# Altium footprint library SOT SOD TO DAPK.PcbLib: 156 footprints (part 7 of 10)
Each footprint in its own frame and in the unit in brackets; x right, y up, seen from the top. Pads: shape width x height; smd on the part's side, far side on the other; paste and mask are expansions set on the pad; w line width, h text height; cw(c..) or ccw(c..) is an arc to the next point about the centre after c.
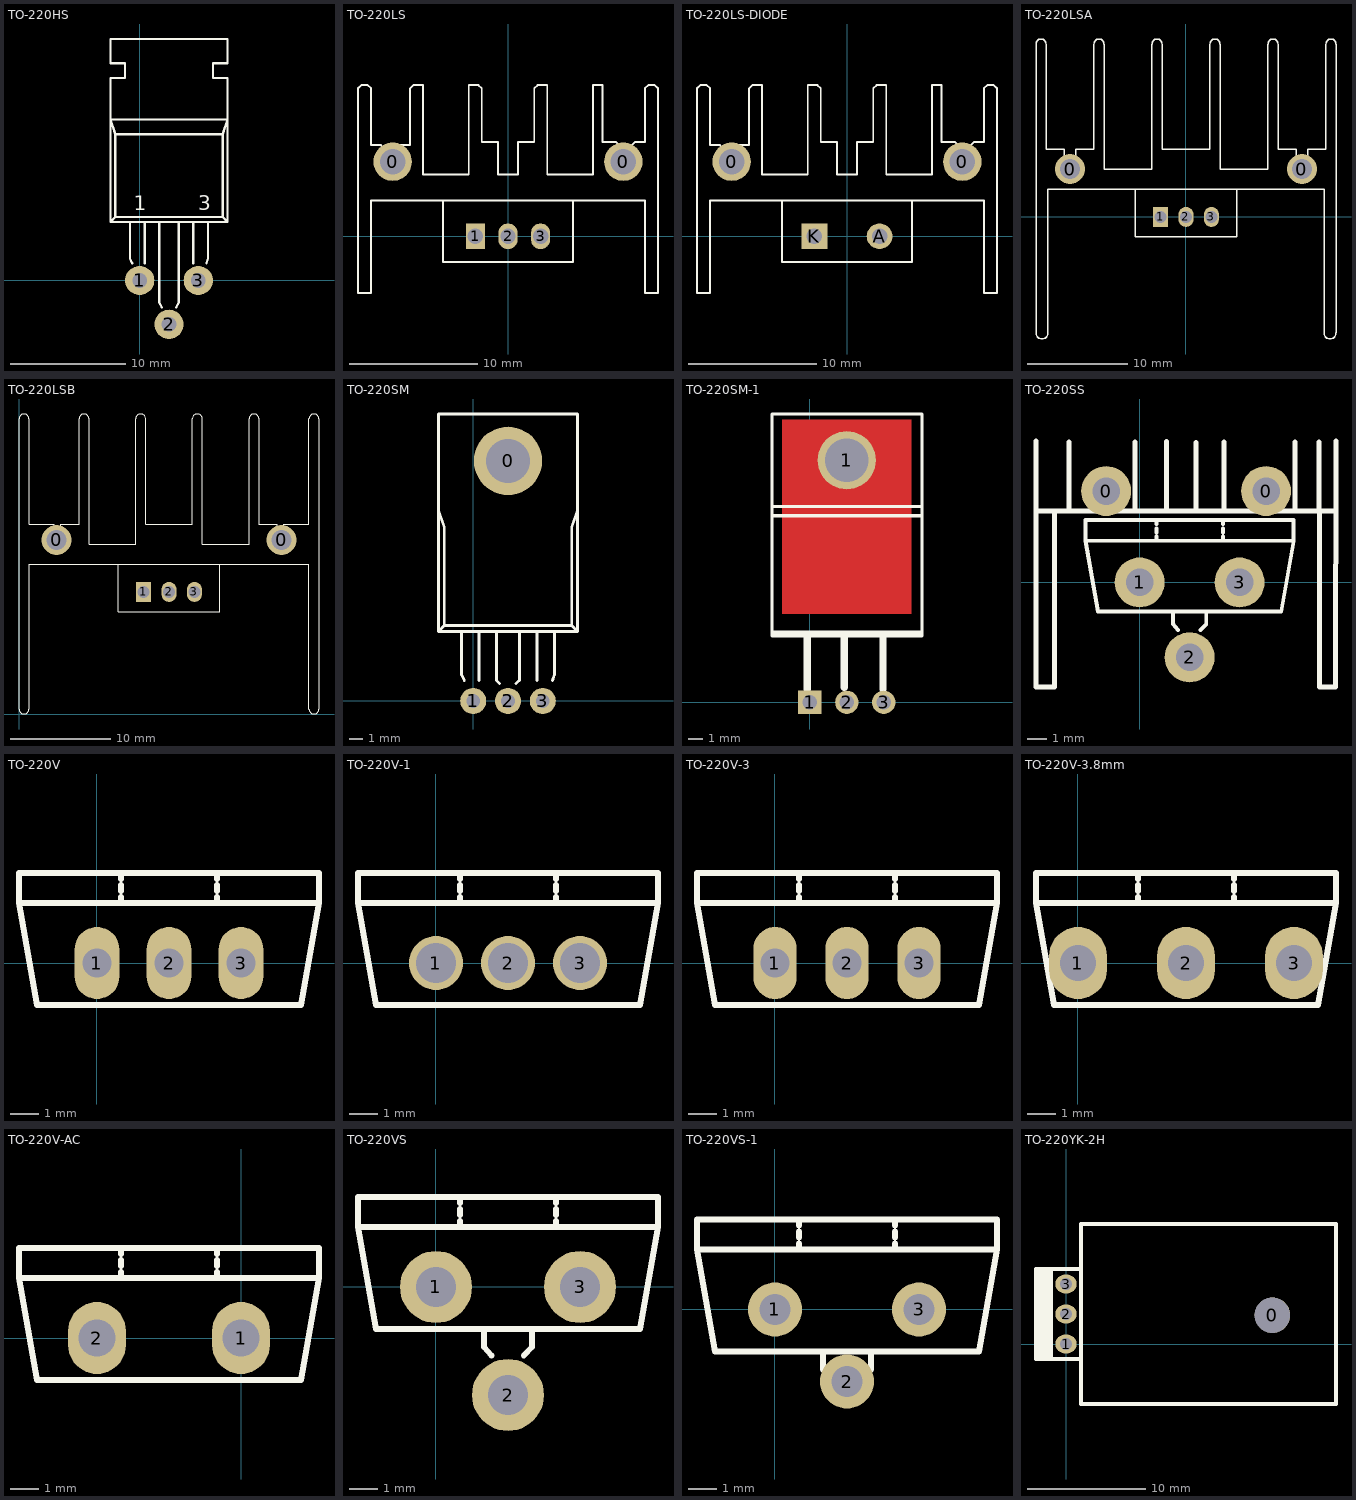
[diagram p6: the footprints below, top view; thin cyan lines are the x and y axes]

## TO-220HS [mil]
pads (3):
  round 100 hole 50: 1(0,0) 2(100,-150) 3(200,0)
Top Overlay:
  lines w7.87: -33.33,200 -33.33,75 -25.8,59.05 ; 16.67,59.05 16.67,200 ; 66.67,200 66.67,-75 75.46,-92.13 ; 124.54,-92.27 133.33,-75 133.33,200 ; 183.33,59.05 183.33,200 ; 228,59.05 233.33,75 233.33,200 ; -100,200 -83.33,216.67 ; -100,200 300,200 ; -100,200 -100,691.67 -50,691.67 -50,741.67 -100,741.67 -100,825 300,825 300,741.67 250,741.67 250,691.67 300,691.67 300,591.67 300,200 ; -83.33,216.67 283.33,216.67 ; -83.33,216.67 -83.33,500 ; -83.33,500 283.33,500 ; -83.33,500 -100,550 300,550 283.33,500 ; 283.33,216.67 283.33,500 ; 283.33,216.67 300,200
  text "1" at -20,240 h50
  text "3" at 200,240 h50
3D body "User Library-TO220 L.STEP": height 177.17, standoff -118.11, extent -98.7,-2.88 295,772.88

## TO-220LS [mm]
pads (5):
  round 3 hole 2: 0(-9,5.822) 0(9,5.822)
  rect 1.5x2 hole 1.2: 1(-2.54,0)
  oval 1.5x2 hole 1.2: 2(0,0) 3(2.54,0)
Top Overlay:
  lines w0.15: -9.668,6.018 -9.668,6.854 -9.922,7.108 -10.684,7.108 -10.684,11.536 -10.938,11.79 -11.446,11.79 -11.7,11.536 -11.7,2.79 -11.7,2.536 -11.7,-4.41 -10.684,-4.41 -10.684,2.79 10.684,2.79 10.684,-4.41 11.7,-4.41 11.7,11.536 11.446,11.79 10.938,11.79 10.684,11.536 10.684,7.362 9.922,7.362 9.668,7.108 9.668,6.079 ; -8.652,6.346 -8.652,6.854 -8.398,7.108 -7.636,7.108 -7.636,11.536 -7.382,11.79 -6.62,11.79 -6.62,4.822 -3.064,4.822 -3.064,11.79 -2.302,11.79 -2.048,11.536 -2.048,7.362 -0.778,7.362 -0.778,4.822 0.778,4.822 0.778,7.362 2.048,7.362 2.048,11.536 2.302,11.79 3.064,11.79 3.064,4.822 6.62,4.822 6.62,11.79 7.382,11.79 7.382,7.362 8.398,7.362 8.652,7.108 8.652,6.346 ; -5.08,2.79 -5.08,-2 5.08,-2 5.08,2.79
3D body "User Library-heat sink-1.step": height 30.62, standoff 0, extent -11.45,-4.535 11.45,11.865
3D body "User Library-POWER MOSFET, NON-SURFACE-MOUNT.step": height 20.8, standoff -7.58, extent -4.834,-1.996 4.818,2.504
3D body "User Library-M3x8.STEP": height 20.6, standoff 15, extent -2.8,-0.35 2.8,9.135

## TO-220LS-DIODE [mm]
pads (4):
  round 3 hole 2: 0(-9,5.822) 0(9,5.822)
  round 2 hole 1.2: A(2.54,0)
  rect 2x2 hole 1.2: K(-2.54,0)
Top Overlay:
  lines w0.15: -9.668,6.018 -9.668,6.854 -9.922,7.108 -10.684,7.108 -10.684,11.536 -10.938,11.79 -11.446,11.79 -11.7,11.536 -11.7,2.79 -11.7,2.536 -11.7,-4.41 -10.684,-4.41 -10.684,2.79 10.684,2.79 10.684,-4.41 11.7,-4.41 11.7,11.536 11.446,11.79 10.938,11.79 10.684,11.536 10.684,7.362 9.922,7.362 9.668,7.108 9.668,6.079 ; -8.652,6.346 -8.652,6.854 -8.398,7.108 -7.636,7.108 -7.636,11.536 -7.382,11.79 -6.62,11.79 -6.62,4.822 -3.064,4.822 -3.064,11.79 -2.302,11.79 -2.048,11.536 -2.048,7.362 -0.778,7.362 -0.778,4.822 0.778,4.822 0.778,7.362 2.048,7.362 2.048,11.536 2.302,11.79 3.064,11.79 3.064,4.822 6.62,4.822 6.62,11.79 7.382,11.79 7.382,7.362 8.398,7.362 8.652,7.108 8.652,6.346 ; -5.08,2.79 -5.08,-2 5.08,-2 5.08,2.79
3D body "User Library-heat sink-1.step": height 30.62, standoff 0, extent -11.45,-4.535 11.45,11.865
3D body "User Library-TO220-D.STEP": height 20.8, standoff -7.58, extent -4.826,-2.075 4.826,2.425
3D body "User Library-M3x8.STEP": height 20.6, standoff 15, extent -2.8,-0.35 2.8,9.135

## TO-220LSA [mm]
pads (5):
  round 3 hole 2: 0(-11.6,4.79) 0(11.6,4.79)
  rect 1.5x2 hole 1.2: 1(-2.54,0)
  oval 1.5x2 hole 1.2: 2(0,0) 3(2.54,0)
Top Overlay:
  lines w0.15: -12.156,5.446 ccw(c-11.6,4.79) -11.035,5.438 ; -12.154,5.446 -12.154,6.79 -14,6.79 -14,17.29 ccw(c-14.5,17.29) -15,17.29 -15,2.79 -15,-11.61 ccw(c-14.4,-11.61) -13.8,-11.61 -13.8,2.79 13.8,2.79 13.8,-11.61 ccw(c14.4,-11.61) 15,-11.61 15,2.79 15,17.29 ccw(c14.5,17.29) 14,17.29 14,6.79 12.154,6.79 12.154,5.438 ; -11.046,5.438 -11.046,6.79 -9.2,6.79 -9.2,17.29 cw(c-8.7,17.29) -8.2,17.29 -8.2,4.79 -3.4,4.79 -3.4,17.29 cw(c-2.9,17.29) -2.4,17.29 -2.4,6.79 2.4,6.79 2.4,17.29 cw(c2.9,17.29) 3.4,17.29 3.4,4.79 8.2,4.79 8.2,17.29 cw(c8.7,17.29) 9.2,17.29 9.2,6.79 11.046,6.79 11.046,5.446 ; -5.08,2.79 -5.08,-2 5.08,-2 5.08,2.79 ; 11.044,5.446 ccw(c11.6,4.79) 12.165,5.438
3D body: height 25, standoff 0, extent -8.859,2.928 9.141,17.435
3D body "User Library-M3x8.STEP": height 20.6, standoff 15, extent -2.8,-0.35 2.8,9.135
3D body "User Library-POWER MOSFET, NON-SURFACE-MOUNT.step": height 20.8, standoff -7.58, extent -4.834,-1.996 4.818,2.504
3D body: height 25, standoff 0, extent -14.855,-12.073 -13.859,16.927
3D body: height 25, standoff 0, extent 14.014,-11.311 15.014,17.689
3D body: height 25, standoff 0, extent -10.599,5.549 -8.799,6.68
3D body: height 25, standoff 0, extent -13.799,5.68 -11.299,6.68
3D body: height 25, standoff 0, extent -13.799,2.688 -11.059,5.085
3D body: height 25, standoff 0, extent -11.059,2.688 -8.799,5.093
3D body: height 25, standoff 0, extent -10.599,5.093 -8.799,5.549
3D body: height 25, standoff 0, extent -13.799,5.085 -11.299,5.68
3D body: height 25, standoff 0, extent 11.701,5.077 14.201,5.672
3D body: height 25, standoff 0, extent 9.201,5.085 11.001,5.541
3D body: height 25, standoff 0, extent 9.201,2.68 11.461,5.085
3D body: height 25, standoff 0, extent 11.461,2.68 14.201,5.077
3D body: height 25, standoff 0, extent 11.701,5.672 14.201,6.672
3D body: height 25, standoff 0, extent 9.201,5.541 11.001,6.672

## TO-220LSB [mm]
pads (5):
  round 3 hole 2: 0(3.75,17.4) 0(26.25,17.4)
  rect 1.5x2 hole 1.2: 1(12.468,12.21)
  oval 1.5x2 hole 1.2: 2(15.008,12.21) 3(17.548,12.21)
Top Overlay:
  lines w0.1: 9.928,15 9.928,10.21 20.088,10.21 20.088,15 ; 24,18.992 25.8,18.992 25.8,17.861 ccw(c26.25,17.392) 26.5,17.992 ; 24,19 24,29.5 ccw(c23.5,29.5) 23,29.5 23,17 18.333,17 18.333,29.5 ccw(c17.833,29.5) 17.333,29.5 17.333,19 12.667,19 12.667,29.5 ccw(c12.167,29.5) 11.667,29.5 11.667,17 7,17 7,29.5 ccw(c6.5,29.5) 6,29.5 6,19 4.2,19 4.2,17.869 cw(c3.75,17.4) 3.5,18 3.5,19 1,19 1,19.01 1,29.5 ccw(c0.5,29.5) 0,29.5 0,0.5 ccw(c0.5,0.5) 1,0.5 1,15 29,15 29,0.5 ccw(c29.5,0.5) 30,0.5 30,29.5 ccw(c29.5,29.5) 29,29.5 29,19.002 ; 26.5,17.992 26.5,18.992 29,18.992 29,19.002 ; 29,19 29,19.002
3D body: height 25, standoff 0, extent 0.004,29.001 1,29.999
3D body: height 25, standoff 0, extent 6.004,29.001 7,29.999
3D body: height 25, standoff 0, extent 11.671,29.001 12.667,29.999
3D body: height 25, standoff 0, extent 17.337,29.001 18.333,29.999
3D body: height 25, standoff 0, extent 23.004,29.001 24,29.999
3D body: height 25, standoff 0, extent 29.004,29.001 30,29.999
3D body: height 25, standoff 0, extent 29.004,0.001 30,0.999
3D body: height 25, standoff 0, extent 0.004,0.001 1,0.999
3D body: height 25, standoff 0, extent 6,14.993 24,29.5
3D body: height 25, standoff 0, extent 24,17.861 25.8,18.992
3D body: height 25, standoff 0, extent 26.5,17.992 29,18.992
3D body: height 25, standoff 0, extent 26.26,15 29,17.397
3D body: height 25, standoff 0, extent 24,15 26.26,17.405
3D body: height 25, standoff 0, extent 24,17.405 25.8,17.861
3D body: height 25, standoff 0, extent 26.5,17.397 29,17.992
3D body: height 25, standoff 0, extent 1,17.405 3.5,18
3D body: height 25, standoff 0, extent 4.2,17.413 6,17.869
3D body: height 25, standoff 0, extent 3.74,15.008 6,17.413
3D body: height 25, standoff 0, extent 1,15.008 3.74,17.405
3D body: height 25, standoff 0, extent 1,18 3.5,19
3D body: height 25, standoff 0, extent 4.2,17.869 6,19
3D body: height 25, standoff 0, extent 0.004,0.5 1,29.5
3D body: height 25, standoff 0, extent 29,0.5 30,29.5
3D body: height 8, standoff -5, extent 3.006,16.652 4.5,18.149
3D body: height 8, standoff -5, extent 25.5,16.643 26.994,18.14
3D body "User Library-POWER MOSFET, NON-SURFACE-MOUNT.step": height 20.8, standoff -7.58, extent 10.174,10.214 19.826,14.714
3D body "User Library-M3x8.STEP": height 20.6, standoff 15, extent 12.2,11.86 17.8,21.345

## TO-220SM [mm]
pads (4):
  round 5 hole 3.2: 0(2.54,17.526)
  round 1.9 hole 1: 1(0,0) 2(2.54,0) 3(5.08,0)
Top Overlay:
  lines w0.2: -2.54,13.97 -2.117,12.7 -2.117,5.503 ; -2.54,17.526 -2.54,18.796 ; -2.54,17.568 -2.54,5.08 ; -2.54,18.838 -2.54,20.955 7.62,20.955 7.62,18.838 ; -0.847,5.08 -0.847,1.905 -0.655,1.5 ; 0.423,1.5 0.423,5.08 ; 1.693,5.08 1.693,1.5 1.923,1.27 ; 3.133,1.27 3.387,1.524 ; 3.387,1.5 3.387,5.08 ; 4.657,1.5 4.657,5.08 ; 5.791,1.5 5.927,1.905 5.927,5.08 ; 7.62,13.97 7.197,12.7 7.197,5.503 ; 7.62,17.526 7.62,18.796 ; 7.62,17.568 7.62,15.028 7.62,5.08 ; -2.54,5.08 7.62,5.08 ; -2.54,5.08 -2.117,5.503 ; -2.117,5.503 7.197,5.503 ; 7.197,5.503 7.62,5.08
3D body "User Library-TO220 L.STEP": height 4.5, standoff -3, extent -2.286,0.054 7.714,19.758

## TO-220SM-1 [mm]
pads (4):
  rect 1.6x1.6 hole 1: 1(0,0)
  round 4 hole 3: 1(2.54,16.637)
  round 1.6 hole 1: 2(2.54,0) 3(5.08,0)
Top Layer:
  rectangle: -1.905,6.071 6.985,19.431
Top Overlay:
  lines w0.22: -2.591,4.699 7.696,4.699 ; -2.591,4.826 7.696,4.826 ; -2.591,12.827 7.696,12.827 ; -2.591,13.462 7.696,13.462 ; -2.591,19.05 -2.591,19.812 7.696,19.812 7.696,4.572 -2.591,4.572 -2.591,19.558
  lines w0.5: -0.178,0.889 -0.178,4.572 ; 2.362,1.016 2.362,4.699 ; 5.029,0.889 5.029,4.572
3D body "User Library-TO220 L.STEP": height 4.5, standoff -3, extent -2.638,-0.127 7.362,19.577
3D body "User Library-TO220 L.STEP": height 4.5, standoff -3, extent -2.46,-0.254 7.54,19.45

## TO-220SS [mm]
pads (5):
  round 2.54 hole 1.4: 0(-1.703,4.644) 0(6.425,4.644) 1(0,0) 2(2.54,-3.81) 3(5.08,0)
Top Overlay:
  lines w0.2: 0.847,2.117 0.847,2.328 ; 0.847,2.54 0.847,2.752 ; 0.847,2.963 0.847,3.175 ; 1.693,-1.482 1.693,-2.117 1.957,-2.416 ; 3.099,-2.416 3.387,-2.117 3.387,-1.482 ; 4.233,2.117 4.233,2.328 ; 4.233,2.54 4.233,2.752 ; 4.233,2.963 4.233,3.175 ; -2.752,2.117 -2.752,3.175 7.832,3.175 7.832,2.117 ; -2.752,2.117 -2.117,-1.482 7.197,-1.482 7.832,2.117 ; -2.752,2.117 7.832,2.117
  lines w0.254: -5.268,-5.311 -4.332,-5.311 -4.332,3.627 ; -5.259,3.628 9.981,3.628 ; -5.259,7.184 -5.257,-5.255 ; -3.588,3.738 -3.588,7.145 ; -0.227,3.754 -0.227,7.129 ; 1.37,3.678 1.37,7.175 ; 2.876,3.662 2.876,7.115 ; 4.29,3.708 4.29,7.145 ; 7.895,3.769 7.895,7.145 ; 9.127,3.769 9.127,7.131 ; 9.146,3.659 9.146,-5.307 9.957,-5.307 9.981,7.184
3D body "User Library-Heatsink-52AS.STEP": height 25, standoff 0, extent -11.595,-0.281 15.405,12.719
3D body "User Library-MOSFET TO_220.STEP": height 23.5, standoff -6.2, extent -2.587,-2.813 7.413,2.667

## TO-220V [mil]
pads (3):
  oval 62x100 hole 40: 1(0,0) 2(100,0) 3(200,0)
Top Overlay:
  lines w7.87: 33.33,83.33 33.33,91.67 ; 33.33,100 33.33,108.33 ; 33.33,116.67 33.33,125 ; 166.67,83.33 166.67,91.67 ; 166.67,100 166.67,108.33 ; 166.67,116.67 166.67,125 ; -108.33,83.33 308.33,83.33 ; -108.33,83.33 -83.33,-58.33 283.33,-58.33 308.33,83.33 ; -108.33,83.33 -108.33,125 308.33,125 308.33,83.33
3D body "User Library-TO220-AB PCB.STEP": height 789.37, standoff -137.8, extent -94.88,-61.02 294.88,114.47

## TO-220V-1 [mil]
pads (3):
  round 75 hole 55: 1(0,0) 2(100,0) 3(200,0)
Top Overlay:
  lines w7.87: 33.33,83.33 33.33,91.67 ; 33.33,100 33.33,108.33 ; 33.33,116.67 33.33,125 ; 166.67,83.33 166.67,91.67 ; 166.67,100 166.67,108.33 ; 166.67,116.67 166.67,125 ; -108.33,83.33 -108.33,125 308.33,125 308.33,83.33 ; -108.33,83.33 -83.33,-58.33 283.33,-58.33 308.33,83.33 ; -108.33,83.33 308.33,83.33
3D body "User Library-TO220-AB Full.STEP": height 746.06, standoff -396.85, extent -94.88,-61.02 294.88,114.47

## TO-220V-3 [mil]
pads (3):
  oval 60x100 hole 40: 1(0,0) 2(100,0) 3(200,0)
Top Overlay:
  lines w7.87: 33.33,83.33 33.33,91.67 ; 33.33,100 33.33,108.33 ; 33.33,116.67 33.33,125 ; 166.67,83.33 166.67,91.67 ; 166.67,100 166.67,108.33 ; 166.67,116.67 166.67,125 ; -108.33,83.33 -108.33,125 308.33,125 308.33,83.33 ; -108.33,83.33 -83.33,-58.33 283.33,-58.33 308.33,83.33 ; -108.33,83.33 308.33,83.33
3D body "User Library-MJF45H11 Transistors PNP TO-220 FULLPAK-3.STEP": height 782.28, standoff -374.02, extent -99.62,-64.42 299.62,121.4

## TO-220V-3.8mm [mil]
pads (3):
  oval 80x100 hole 50: 1(0,0) 2(150,0) 3(300,0)
Top Overlay:
  lines w7.87: 83.33,83.33 83.33,91.67 ; 83.33,100 83.33,108.33 ; 83.33,116.67 83.33,125 ; 216.67,83.33 216.67,91.67 ; 216.67,100 216.67,108.33 ; 216.67,116.67 216.67,125 ; -58.33,83.33 358.33,83.33 ; -58.33,83.33 -33.33,-58.33 333.33,-58.33 358.33,83.33 ; -58.33,83.33 -58.33,125 358.33,125 358.33,83.33
3D body "User Library-TO220-AB PCB.STEP": height 789.37, standoff -137.8, extent -44.88,-61.02 344.88,114.47

## TO-220V-AC [mil]
pads (2):
  oval 80x100 hole 51.18: 1(0,0) 2(-200,0)
Top Overlay:
  lines w7.87: -166.67,83.33 -166.67,91.67 ; -166.67,100 -166.67,108.33 ; -166.67,116.67 -166.67,125 ; -33.33,83.33 -33.33,91.67 ; -33.33,100 -33.33,108.33 ; -33.33,116.67 -33.33,125 ; -308.33,83.33 108.33,83.33 ; -308.33,83.33 -283.33,-58.33 83.33,-58.33 108.33,83.33 ; -308.33,83.33 -308.33,125 108.33,125 108.33,83.33
3D body "IC2.STEP": height 767.72, standoff -157.48, extent -306.69,-56.97 106.69,128.07

## TO-220VS [mil]
pads (3):
  round 100 hole 55: 1(0,0) 2(100,-150) 3(200,0)
Top Overlay:
  lines w7.87: 33.33,83.33 33.33,91.67 ; 33.33,100 33.33,108.33 ; 33.33,116.67 33.33,125 ; 66.67,-58.33 66.67,-83.33 77.03,-95.12 ; 122.02,-95.12 133.33,-83.33 133.33,-58.33 ; 166.67,83.33 166.67,91.67 ; 166.67,100 166.67,108.33 ; 166.67,116.67 166.67,125 ; -108.33,83.33 308.33,83.33 ; -108.33,83.33 -83.33,-58.33 283.33,-58.33 308.33,83.33 ; -108.33,83.33 -108.33,125 308.33,125 308.33,83.33
3D body "User Library-MOSFET TO_220.STEP": height 767.72, standoff -401.57, extent -101.85,-130.75 291.85,85

## TO-220VS-1 [mm]
pads (3):
  round 1.905 hole 1.1: 1(0,0) 2(2.54,-2.54) 3(5.08,0)
Top Overlay:
  lines w0.2: 0.847,2.117 0.847,2.328 ; 0.847,2.54 0.847,2.752 ; 0.847,2.963 0.847,3.175 ; 1.693,-1.482 1.693,-2.117 1.957,-2.416 ; 3.099,-2.416 3.387,-2.117 3.387,-1.482 ; 4.233,2.117 4.233,2.328 ; 4.233,2.54 4.233,2.752 ; 4.233,2.963 4.233,3.175 ; -2.752,2.117 -2.752,3.175 7.832,3.175 7.832,2.117 ; -2.752,2.117 -2.117,-1.482 7.197,-1.482 7.832,2.117 ; -2.752,2.117 7.832,2.117
3D body "User Library-TO220.STEP": height 21.21, standoff -5.95, extent -2.66,-2.838 7.74,2.903

## TO-220YK-2H [mil]
pads (4):
  round 118.11 hole 118.11: 0(688,96)
  oval 71x63 hole 39: 1(0,0) 2(0,100) 3(0,200)
Top Overlay:
  rectangle: -100,-50 -50,250
  lines w12: -50,-50 -50,250 ; -100,-50 50,-50 50,250 -100,250 -100,-50 ; 50,-200 900,-200 900,400 50,400 50,-200
3D body: height 1377.95, standoff 39.37, extent 45,-200 905,400
3D body "User Library-TO220-AB PCB.STEP": height 789.37, standoff -137.8, extent -136.02,-89.88 39.47,299.88